# Altium footprint library MOTHER_BOARD_LS1021_v1.01.PcbLib: 69 footprints (part 4 of 5)
Each footprint in its own frame and in the unit in brackets; x right, y up, seen from the top. Pads: shape width x height; smd on the part's side, far side on the other; paste and mask are expansions set on the pad; w line width, h text height; cw(c..) or ccw(c..) is an arc to the next point about the centre after c.
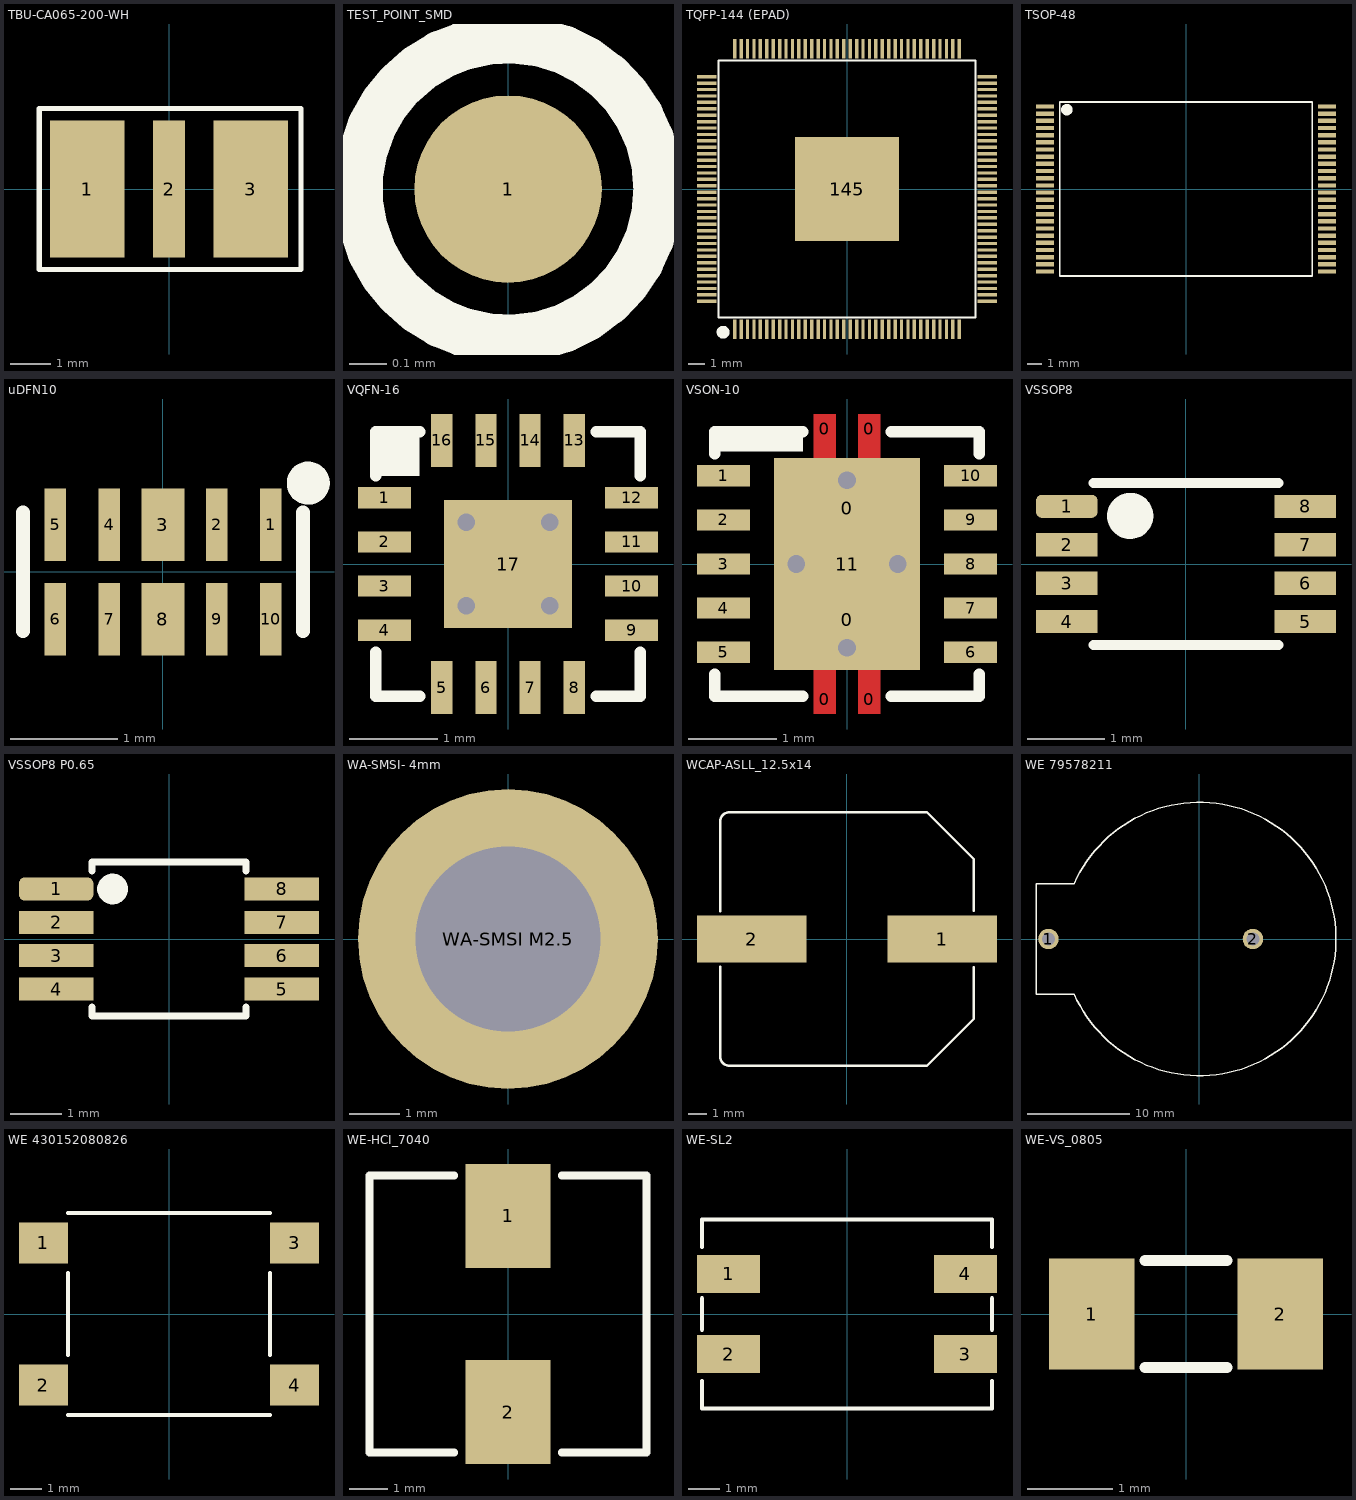
[diagram p3: the footprints below, top view; thin cyan lines are the x and y axes]

## TBU-CA065-200-WH [mm]
pads (3):
  rect 1.85x3.4 smd paste-0.15 mask+0.05: 1(-2.025,0) 3(2.025,0)
  rect 0.8x3.4 smd paste-0.15 mask+0.05: 2(0,0)
Top Overlay:
  lines w0.13: -3.225,-2 3.275,-2 3.275,2 -3.225,2 -3.225,-2
3D body "TBU-CA.STEP": height 0.88, standoff 0.01, extent -3.25,-2 3.25,2

## TEST_POINT_SMD [mm]
pads (1):
  round 0.5 smd paste-0.5 mask+0.05: 1(0,0)
Top Overlay:
  circle w0.13: c0,0 r0.4

## TQFP-144 (EPAD) [mm]
pads (145):
  rect 0.21x1.2 smd paste-0.02 mask+0.03: 1(-7,-8.75) 2(-6.6,-8.75) 3(-6.2,-8.75) 4(-5.8,-8.75) 5(-5.4,-8.75) 6(-5,-8.75) 7(-4.6,-8.75) 8(-4.2,-8.75) 9(-3.8,-8.75) 10(-3.4,-8.75) 11(-3,-8.75) 12(-2.6,-8.75) 13(-2.2,-8.75) 14(-1.8,-8.75) 15(-1.4,-8.75) 16(-1,-8.75) 17(-0.6,-8.75) 18(-0.2,-8.75) 19(0.2,-8.75) 20(0.6,-8.75) 21(1,-8.75) 22(1.4,-8.75) 23(1.8,-8.75) 24(2.2,-8.75) 25(2.6,-8.75) 26(3,-8.75) 27(3.4,-8.75) 28(3.8,-8.75) 29(4.2,-8.75) 30(4.6,-8.75) 31(5,-8.75) 32(5.4,-8.75) 33(5.8,-8.75) 34(6.2,-8.75) 35(6.6,-8.75) 36(7,-8.75) 73(7,8.75) 74(6.6,8.75) 75(6.2,8.75) 76(5.8,8.75) 77(5.4,8.75) 78(5,8.75) 79(4.6,8.75) 80(4.2,8.75) 81(3.8,8.75) 82(3.4,8.75) 83(3,8.75) 84(2.6,8.75) 85(2.2,8.75) 86(1.8,8.75) 87(1.4,8.75) 88(1,8.75) 89(0.6,8.75) 90(0.2,8.75) 91(-0.2,8.75) 92(-0.6,8.75) 93(-1,8.75) 94(-1.4,8.75) 95(-1.8,8.75) 96(-2.2,8.75) 97(-2.6,8.75) 98(-3,8.75) 99(-3.4,8.75) 100(-3.8,8.75) 101(-4.2,8.75) 102(-4.6,8.75) 103(-5,8.75) 104(-5.4,8.75) 105(-5.8,8.75) 106(-6.2,8.75) 107(-6.6,8.75) 108(-7,8.75)
  rect 1.2x0.21 smd paste-0.02 mask+0.03: 37(8.75,-7) 38(8.75,-6.6) 39(8.75,-6.2) 40(8.75,-5.8) 41(8.75,-5.4) 42(8.75,-5) 43(8.75,-4.6) 44(8.75,-4.2) 45(8.75,-3.8) 46(8.75,-3.4) 47(8.75,-3) 48(8.75,-2.6) 49(8.75,-2.2) 50(8.75,-1.8) 51(8.75,-1.4) 52(8.75,-1) 53(8.75,-0.6) 54(8.75,-0.2) 55(8.75,0.2) 56(8.75,0.6) 57(8.75,1) 58(8.75,1.4) 59(8.75,1.8) 60(8.75,2.2) 61(8.75,2.6) 62(8.75,3) 63(8.75,3.4) 64(8.75,3.8) 65(8.75,4.2) 66(8.75,4.6) 67(8.75,5) 68(8.75,5.4) 69(8.75,5.8) 70(8.75,6.2) 71(8.75,6.6) 72(8.75,7) 109(-8.75,7) 110(-8.75,6.6) 111(-8.75,6.2) 112(-8.75,5.8) 113(-8.75,5.4) 114(-8.75,5) 115(-8.75,4.6) 116(-8.75,4.2) 117(-8.75,3.8) 118(-8.75,3.4) 119(-8.75,3) 120(-8.75,2.6) 121(-8.75,2.2) 122(-8.75,1.8) 123(-8.75,1.4) 124(-8.75,1) 125(-8.75,0.6) 126(-8.75,0.2) 127(-8.75,-0.2) 128(-8.75,-0.6) 129(-8.75,-1) 130(-8.75,-1.4) 131(-8.75,-1.8) 132(-8.75,-2.2) 133(-8.75,-2.6) 134(-8.75,-3) 135(-8.75,-3.4) 136(-8.75,-3.8) 137(-8.75,-4.2) 138(-8.75,-4.6) 139(-8.75,-5) 140(-8.75,-5.4) 141(-8.75,-5.8) 142(-8.75,-6.2) 143(-8.75,-6.6) 144(-8.75,-7)
  rect 6.5x6.5 smd paste-8 mask+0.05: 145(0,0)
Top Overlay:
  circle w0.4: c-7.725,-8.925 r0.2
  lines w0.13: -8,-8 8,-8 8,8 -8,8 -8,-8
Top Paste:
  rectangle: -1.85,2.2 -0.85,3.2
  rectangle: -0.5,2.2 0.5,3.2
  rectangle: 0.85,2.2 1.85,3.2
  rectangle: 2.2,2.2 3.2,3.2
  region: -2.2,2.2 -2.2,3.2 -3.2,3.2 -3.2,2.2
  region: -2.2,0.85 -2.2,1.85 -3.2,1.85 -3.2,0.85
  region: -2.2,-0.5 -2.2,0.5 -3.2,0.5 -3.2,-0.5
  region: -2.2,-1.85 -2.2,-0.85 -3.2,-0.85 -3.2,-1.85
  region: -2.2,-3.2 -2.2,-2.2 -3.2,-2.2 -3.2,-3.2
  rectangle: 2.2,0.85 3.2,1.85
  rectangle: 0.85,0.85 1.85,1.85
  rectangle: -0.5,0.85 0.5,1.85
  rectangle: -1.85,0.85 -0.85,1.85
  rectangle: 2.2,-0.5 3.2,0.5
  rectangle: 0.85,-0.5 1.85,0.5
  rectangle: -0.5,-0.5 0.5,0.5
  rectangle: -1.85,-0.5 -0.85,0.5
  rectangle: 2.2,-1.85 3.2,-0.85
  rectangle: 0.85,-1.85 1.85,-0.85
  rectangle: -0.5,-1.85 0.5,-0.85
  rectangle: -1.85,-1.85 -0.85,-0.85
  rectangle: 2.2,-3.2 3.2,-2.2
  rectangle: 0.85,-3.2 1.85,-2.2
  rectangle: -0.5,-3.2 0.5,-2.2
  rectangle: -1.85,-3.2 -0.85,-2.2
3D body "TQFP144-0_4.STEP": height 1.2, standoff 0, extent -9,-9 9,9

## TSOP-48 [mm]
pads (48):
  rect 1.25x0.3 smd paste-0.02 mask+0.05: 1(-9.825,5.75) 2(-9.825,5.25) 3(-9.825,4.75) 4(-9.825,4.25) 5(-9.825,3.75) 6(-9.825,3.25) 7(-9.825,2.75) 8(-9.825,2.25) 9(-9.825,1.75) 10(-9.825,1.25) 11(-9.825,0.75) 12(-9.825,0.25) 13(-9.825,-0.25) 14(-9.825,-0.75) 15(-9.825,-1.25) 16(-9.825,-1.75) 17(-9.825,-2.25) 18(-9.825,-2.75) 19(-9.825,-3.25) 20(-9.825,-3.75) 21(-9.825,-4.25) 22(-9.825,-4.75) 23(-9.825,-5.25) 24(-9.825,-5.75) 25(9.825,-5.75) 26(9.825,-5.25) 27(9.825,-4.75) 28(9.825,-4.25) 29(9.825,-3.75) 30(9.825,-3.25) 31(9.825,-2.75) 32(9.825,-2.25) 33(9.825,-1.75) 34(9.825,-1.25) 35(9.825,-0.75) 36(9.825,-0.25) 37(9.825,0.25) 38(9.825,0.75) 39(9.825,1.25) 40(9.825,1.75) 41(9.825,2.25) 42(9.825,2.75) 43(9.825,3.25) 44(9.825,3.75) 45(9.825,4.25) 46(9.825,4.75) 47(9.825,5.25) 48(9.825,5.75)
Top Overlay:
  circle w0.4: c-8.3,5.525 r0.2
  lines w0.13: -8.8,-6.05 8.8,-6.05 8.8,6.05 -8.8,6.05 -8.8,-6.05
3D body "TSOP-48.STEP": height 1.2, standoff 0, extent -10.1,-6.05 10.1,6.05

## uDFN10 [mm]
pads (10):
  rect 0.2x0.675 smd paste+0 mask+0.05: 1(1,0.44) 2(0.5,0.44) 4(-0.5,0.44) 5(-1,0.44) 6(-1,-0.44) 7(-0.5,-0.44) 9(0.5,-0.44) 10(1,-0.44)
  rect 0.4x0.675 smd paste+0 mask+0.05: 3(0,0.44) 8(0,-0.44)
Top Overlay:
  circle w0.2: c1.35,0.825 r0.1
  lines w0.13: -1.3,-0.55 -1.3,0.55 ; 1.3,-0.55 1.3,0.55
3D body: height 0.55, standoff 0, extent -1.3,-0.55 1.3,0.55

## VQFN-16 [mm]
pads (17):
  rect 0.6x0.24 smd paste+0 mask+0.05: 1(-1.4,0.75) 2(-1.4,0.25) 3(-1.4,-0.25) 4(-1.4,-0.75) 9(1.4,-0.75) 10(1.4,-0.25) 11(1.4,0.25) 12(1.4,0.75)
  rect 0.24x0.6 smd paste+0 mask+0.05: 5(-0.75,-1.4) 6(-0.25,-1.4) 7(0.25,-1.4) 8(0.75,-1.4) 13(0.75,1.4) 14(0.25,1.4) 15(-0.25,1.4) 16(-0.75,1.4)
  rect 1.45x1.45 smd paste+0 mask+0.05: 17(0,0)
via 0.475,-0.475 diameter 0.45 hole 0.2
via -0.475,-0.475 diameter 0.45 hole 0.2
via -0.475,0.475 diameter 0.45 hole 0.2
via 0.475,0.475 diameter 0.45 hole 0.2
Top Overlay:
  rectangle: -1.5,1 -1,1.5
  lines w0.13: -1.5,-1 -1.5,-1.5 -1,-1.5 ; -1.5,1 -1.5,1.5 -1,1.5 ; 1,-1.5 1.5,-1.5 1.5,-1 ; 1,1.5 1.5,1.5 1.5,1
3D body: height 1, standoff 0.05, extent -1.5,-1.5 1.5,1.5

## VSON-10 [mm]
pads (17):
  rect 0.25x0.34 on Top Paste paste+0 mask+0.05: 0(-0.25,-1.53) 0(-0.25,1.53) 0(0.25,-1.53) 0(0.25,1.53)
  rect 1.5x1.06 on Top Paste paste+0 mask+0.05: 0(0,-0.63) 0(0,0.63)
  rect 0.6x0.24 smd paste+0 mask+0.05: 1(-1.4,1) 2(-1.4,0.5) 3(-1.4,0) 4(-1.4,-0.5) 5(-1.4,-1) 6(1.4,-1) 7(1.4,-0.5) 8(1.4,0) 9(1.4,0.5) 10(1.4,1)
  rect 1.65x2.4 smd paste-5 mask+0.05: 11(0,0)
via 0.575,0 diameter 0.45 hole 0.2
via -0.575,0 diameter 0.45 hole 0.2
via 0,0.95 diameter 0.45 hole 0.2
via 0,-0.95 diameter 0.45 hole 0.2
Top Layer:
  region: -0.825,1.2 -0.375,1.2 -0.375,1.7 -0.125,1.7 -0.125,1.2 0.125,1.2 0.125,1.7 0.375,1.7 0.375,1.2 0.825,1.2 0.825,-1.2 0.375,-1.2 0.375,-1.7 0.125,-1.7 0.125,-1.2 -0.125,-1.2 -0.125,-1.7 -0.375,-1.7 -0.375,-1.2 -0.825,-1.2
Top Overlay:
  region: -1.5,1.275 -0.5,1.275 -0.5,1.55 -1.5,1.55
  lines w0.13: -1.5,-1.25 -1.5,-1.5 -0.5,-1.5 ; -1.5,1.25 -1.5,1.5 -0.5,1.5 ; 0.5,-1.5 1.5,-1.5 1.5,-1.25 ; 0.5,1.5 1.5,1.5 1.5,1.25
3D body "PVSON-10.step": height 0.9, standoff 0, extent -1.501,-1.501 1.501,1.501

## VSSOP8 [mm]
pads (8):
  rrect50% 0.8x0.3 smd paste-0.03 mask+0.05: 1(-1.55,0.75)
  rect 0.8x0.3 smd paste-0.03 mask+0.05: 2(-1.55,0.25) 3(-1.55,-0.25) 4(-1.55,-0.75) 5(1.55,-0.75) 6(1.55,-0.25) 7(1.55,0.25) 8(1.55,0.75)
Top Overlay:
  circle w0.3: c-0.725,0.625 r0.15
  lines w0.13: -1.2,-1.05 1.2,-1.05 ; -1.2,1.05 1.2,1.05
3D body "VSSOP-8.step": height 0.9, standoff 0, extent -1.6,-1.05 1.6,1.05

## VSSOP8 P0.65 [mm]
pads (8):
  rrect50% 1.45x0.45 smd paste-0.03 mask+0.05: 1(-2.2,0.975)
  rect 1.45x0.45 smd paste-0.03 mask+0.05: 2(-2.2,0.325) 3(-2.2,-0.325) 4(-2.2,-0.975) 5(2.2,-0.975) 6(2.2,-0.325) 7(2.2,0.325) 8(2.2,0.975)
Top Overlay:
  circle w0.3: c-1.1,0.975 r0.15
  lines w0.13: -1.5,-1.325 -1.5,-1.5 1.5,-1.5 1.5,-1.325 ; -1.5,1.325 -1.5,1.5 1.5,1.5 1.5,1.325
3D body "VSSOP 8.step": height 1.15, standoff 0, extent -2.522,-1.55 2.522,1.55

## WA-SMSI- 4mm [mm]
pads (1):
  round 6 / inner round 4.5 / far side round 4.5 hole 3.7: "WA-SMSI M2.5"(0,0)
Top Paste:
  region: -2.934,-0.183 -1.902,-0.183 -1.879,-0.346 -1.792,-0.663 -1.651,-0.961 -1.462,-1.23 -1.23,-1.462 -0.961,-1.651 -0.663,-1.792 -0.346,-1.879 -0.183,-1.902 -0.183,-2.934 -0.449,-2.917 -0.966,-2.789 -1.452,-2.57 -1.89,-2.267 -2.267,-1.89 -2.57,-1.452 -2.789,-0.966 -2.917,-0.449
  region: -0.183,2.934 -0.183,1.902 -0.346,1.879 -0.663,1.792 -0.961,1.651 -1.23,1.462 -1.462,1.23 -1.651,0.961 -1.792,0.663 -1.879,0.346 -1.902,0.183 -2.934,0.183 -2.917,0.449 -2.789,0.966 -2.57,1.452 -2.267,1.89 -1.89,2.267 -1.452,2.57 -0.966,2.789 -0.449,2.917
  region: 2.934,0.183 1.902,0.183 1.879,0.346 1.792,0.663 1.651,0.961 1.462,1.23 1.23,1.462 0.961,1.651 0.663,1.792 0.346,1.879 0.183,1.902 0.183,2.934 0.449,2.917 0.966,2.789 1.452,2.57 1.89,2.267 2.267,1.89 2.57,1.452 2.789,0.966 2.917,0.449
  region: 0.183,-2.934 0.183,-1.902 0.346,-1.879 0.663,-1.792 0.961,-1.651 1.23,-1.462 1.462,-1.23 1.651,-0.961 1.792,-0.663 1.879,-0.346 1.902,-0.183 2.934,-0.183 2.917,-0.449 2.789,-0.966 2.57,-1.452 2.267,-1.89 1.89,-2.267 1.452,-2.57 0.966,-2.789 0.449,-2.917
3D body "9774040151.stp": height 4, standoff -1.4, extent -2.55,-2.547 2.55,2.547

## WCAP-ASLL_12.5x14 [mm]
pads (2):
  rect 5.8x2.5 smd paste-0.1 mask+0.05: 1(5.05,0) 2(-5.05,0)
Top Overlay:
  lines w0.13: -6.725,-1.475 -6.725,-6.225 ccw(c-6.225,-6.225) -6.225,-6.725 4.225,-6.725 6.725,-4.225 6.725,-1.485 ; -6.725,1.475 -6.725,6.225 cw(c-6.225,6.225) -6.225,6.725 4.225,6.725 6.725,4.225 6.725,1.485
3D body "12.5x14x4.5.stp": height 14, standoff 0, extent -7.1,-6.725 7.1,6.725

## WE 79578211 [mm]
pads (2):
  round 2 hole 1.3 mask+0.05: 1(-14.755,0) 2(5.245,0)
Top Overlay:
  lines w0.13: -12.236,-5.4 ccw(c0,0) -12.237,5.399 ; -12.237,5.4 -15.975,5.4 -15.975,-5.4 -12.236,-5.4
3D body "79578211.stp": height 9.6, standoff -3.2, extent -15.97,-13.375 13.375,13.375

## WE 430152080826 [mm]
pads (4):
  rect 1.55x1.3 smd paste-0.02 mask+0.05: 1(-3.975,2.25) 2(-3.975,-2.25) 3(3.975,2.25) 4(3.975,-2.25)
Top Overlay:
  lines w0.13: -3.2,-3.2 3.2,-3.2 ; -3.2,-1.3 -3.2,1.3 ; -3.2,3.2 3.2,3.2 ; 3.2,-1.3 3.2,1.3
3D body "4301x20808x6.stp": height 8.03, standoff 0.03, extent -4.5,-3.1 4.5,3.1

## WE-HCI_7040 [mm]
pads (2):
  rect 2.2x2.7 smd paste-0.1 mask+0.05: 1(0,2.55) 2(0,-2.55)
Top Overlay:
  lines w0.2: -1.4,-3.6 -3.6,-3.6 -3.6,3.6 -1.4,3.6 ; 1.4,-3.6 3.6,-3.6 3.6,3.6 1.4,3.6
3D body "744311x.stp": height 4, standoff 0, extent -3.45,-3.5 3.45,3.5

## WE-SL2 [mm]
pads (4):
  rect 2x1.2 smd paste-0.05 mask+0.05: 1(-3.757,1.27) 2(-3.757,-1.27) 3(3.757,-1.27) 4(3.757,1.27)
Top Overlay:
  lines w0.13: -4.6,-2.125 -4.6,-3 4.6,-3 4.6,-2.125 ; -4.6,-0.5 -4.6,0.5 ; -4.6,2.125 -4.6,3 4.6,3 4.6,2.125 ; 4.6,-0.5 4.6,0.5
3D body "WE-SL2.stp": height 5, standoff 0, extent -4.6,-3 4.6,3

## WE-VS_0805 [mm]
pads (2):
  rect 1x1.3 smd mask+0.05: 1(-1.1,0) 2(1.1,0)
Top Overlay:
  lines w0.13: -0.475,-0.625 0.475,-0.625 ; -0.475,0.625 0.475,0.625
3D body "WE-VS_0805.stp": height 1.2, standoff 0, extent -1,-0.625 1,0.625